# Altium footprint library Package_SO.PcbLib: 333 footprints (part 16 of 21)
Each footprint in its own frame and in the unit in brackets; x right, y up, seen from the top. Pads: shape width x height; smd on the part's side, far side on the other; paste and mask are expansions set on the pad; w line width, h text height; cw(c..) or ccw(c..) is an arc to the next point about the centre after c.
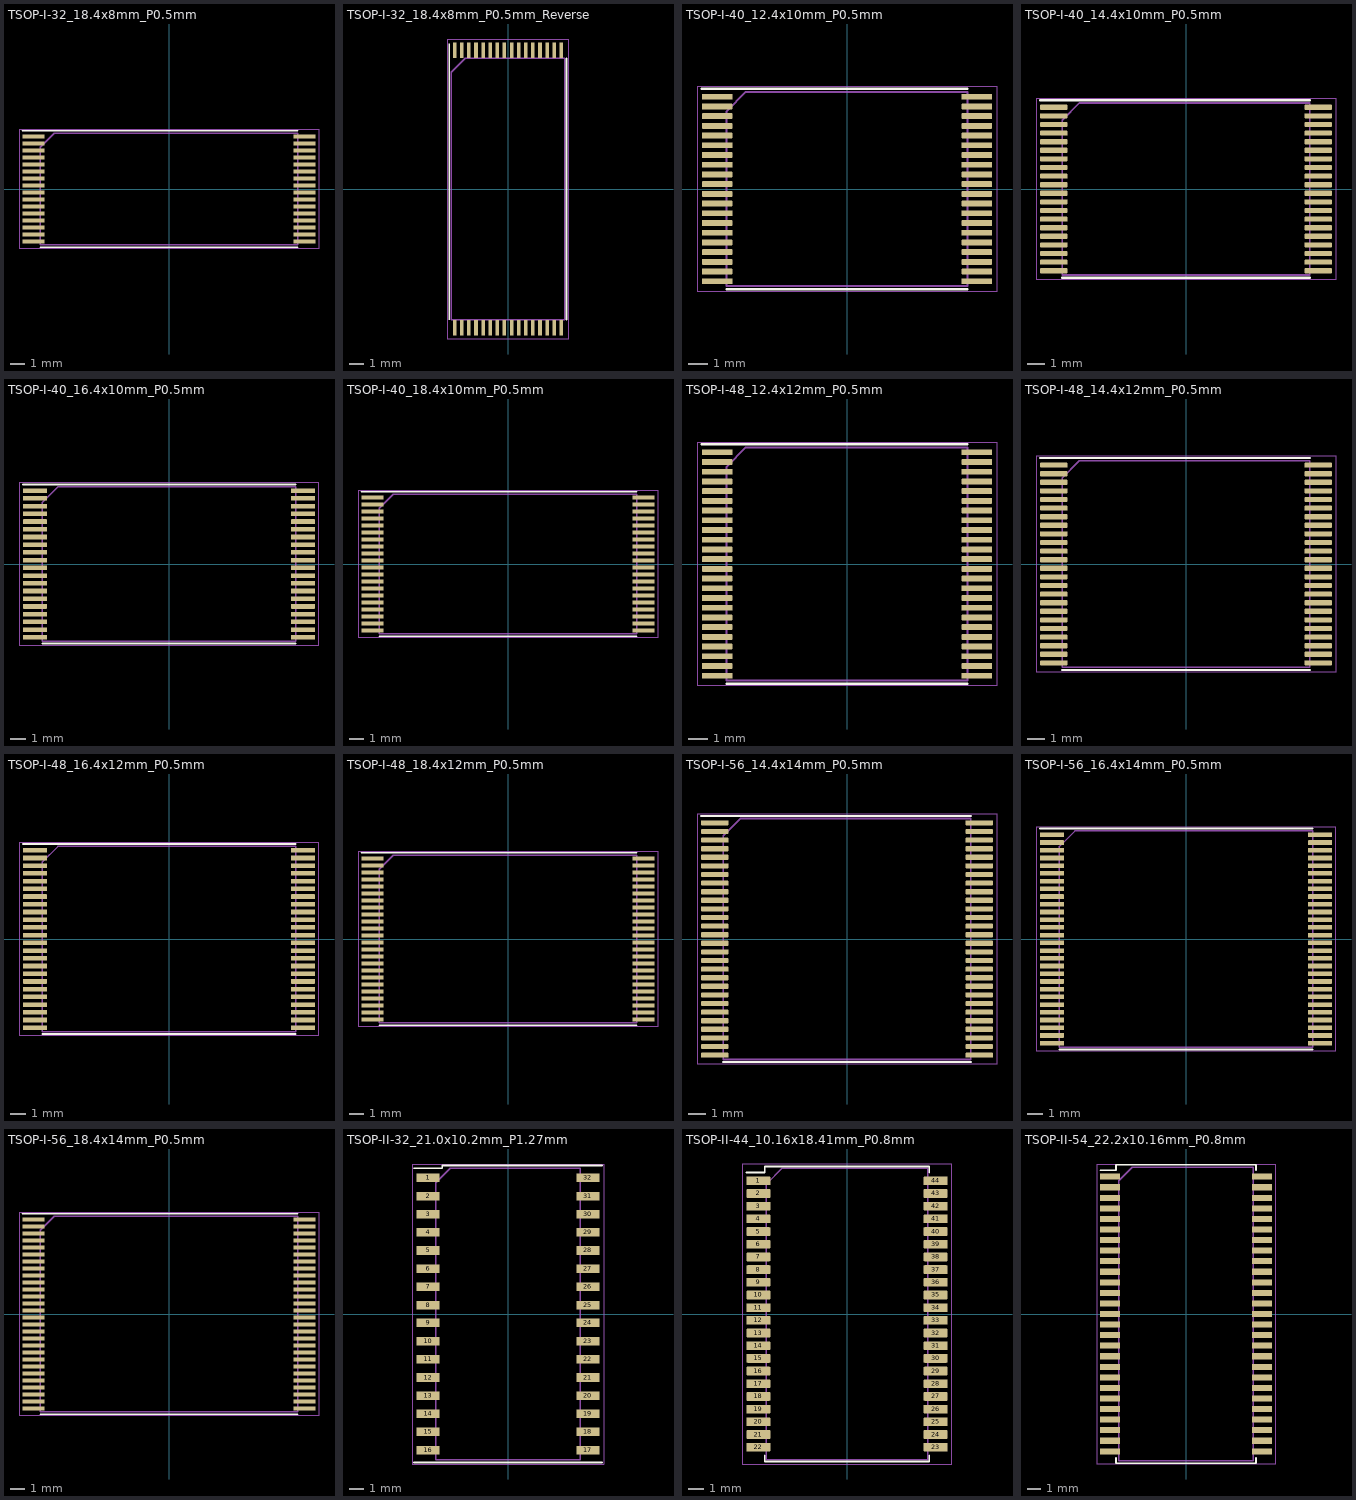
[diagram p15: the footprints below, top view; thin cyan lines are the x and y axes]

## TSOP-I-32_18.4x8mm_P0.5mm [mm]
pads (32):
  rrect25% 1.575x0.3 smd: 1(-9.687,3.75) 2(-9.687,3.25) 3(-9.687,2.75) 4(-9.687,2.25) 5(-9.687,1.75) 6(-9.687,1.25) 7(-9.687,0.75) 8(-9.687,0.25) 9(-9.687,-0.25) 10(-9.687,-0.75) 11(-9.687,-1.25) 12(-9.687,-1.75) 13(-9.687,-2.25) 14(-9.687,-2.75) 15(-9.687,-3.25) 16(-9.687,-3.75) 17(9.687,-3.75) 18(9.687,-3.25) 19(9.687,-2.75) 20(9.687,-2.25) 21(9.687,-1.75) 22(9.687,-1.25) 23(9.687,-0.75) 24(9.687,-0.25) 25(9.687,0.25) 26(9.687,0.75) 27(9.687,1.25) 28(9.687,1.75) 29(9.687,2.25) 30(9.687,2.75) 31(9.687,3.25) 32(9.687,3.75)
F.SilkS:
  lines w0.12: -10.475,4.16 0,4.16 9.2,4.16 ; -9.2,-4.16 0,-4.16 9.2,-4.16
F.CrtYd:
  lines w0.05: -10.73,-4.25 -10.73,4.25 10.73,4.25 10.73,-4.25 -10.73,-4.25
F.Fab:
  lines w0.1: -9.2,-4 9.2,-4 9.2,4 -8.2,4 -9.2,3 -9.2,-4
  text "'.Designator'" at -4.047,-0.84 h1

## TSOP-I-32_18.4x8mm_P0.5mm_Reverse [mm]
pads (32):
  rect 0.25x1.1 smd: 1(-3.75,9.75) 2(-3.25,9.75) 3(-2.75,9.75) 4(-2.25,9.75) 5(-1.75,9.75) 6(-1.25,9.75) 7(-0.75,9.75) 8(-0.25,9.75) 9(0.25,9.75) 10(0.75,9.75) 11(1.25,9.75) 12(1.75,9.75) 13(2.25,9.75) 14(2.75,9.75) 15(3.25,9.75) 16(3.75,9.75) 17(3.75,-9.75) 18(3.25,-9.75) 19(2.75,-9.75) 20(2.25,-9.75) 21(1.75,-9.75) 22(1.25,-9.75) 23(0.75,-9.75) 24(0.25,-9.75) 25(-0.25,-9.75) 26(-0.75,-9.75) 27(-1.25,-9.75) 28(-1.75,-9.75) 29(-2.25,-9.75) 30(-2.75,-9.75) 31(-3.25,-9.75) 32(-3.75,-9.75)
F.SilkS:
  lines w0.1: -4.12,-9.2 -4.12,10.2
  lines w0.12: 4.12,-9.2 4.12,9.2
F.CrtYd:
  lines w0.05: -4.25,-10.55 -4.25,10.55 4.25,10.55 4.25,-10.55 -4.25,-10.55
F.Fab:
  lines w0.1: -4,-9.2 -4,8.2 -3,9.2 4,9.2 4,-9.2 -4,-9.2
  text "'.Designator'" at -4.047,-0.84 h1

## TSOP-I-40_12.4x10mm_P0.5mm [mm]
pads (40):
  rrect25% 1.575x0.3 smd: 1(-6.687,4.75) 2(-6.687,4.25) 3(-6.687,3.75) 4(-6.687,3.25) 5(-6.687,2.75) 6(-6.687,2.25) 7(-6.687,1.75) 8(-6.687,1.25) 9(-6.687,0.75) 10(-6.687,0.25) 11(-6.687,-0.25) 12(-6.687,-0.75) 13(-6.687,-1.25) 14(-6.687,-1.75) 15(-6.687,-2.25) 16(-6.687,-2.75) 17(-6.687,-3.25) 18(-6.687,-3.75) 19(-6.687,-4.25) 20(-6.687,-4.75) 21(6.687,-4.75) 22(6.687,-4.25) 23(6.687,-3.75) 24(6.687,-3.25) 25(6.687,-2.75) 26(6.687,-2.25) 27(6.687,-1.75) 28(6.687,-1.25) 29(6.687,-0.75) 30(6.687,-0.25) 31(6.687,0.25) 32(6.687,0.75) 33(6.687,1.25) 34(6.687,1.75) 35(6.687,2.25) 36(6.687,2.75) 37(6.687,3.25) 38(6.687,3.75) 39(6.687,4.25) 40(6.687,4.75)
F.SilkS:
  lines w0.12: -7.475,5.16 0,5.16 6.2,5.16 ; -6.2,-5.16 0,-5.16 6.2,-5.16
F.CrtYd:
  lines w0.05: -7.72,-5.25 -7.72,5.25 7.72,5.25 7.72,-5.25 -7.72,-5.25
F.Fab:
  lines w0.1: -6.2,-5 6.2,-5 6.2,5 -5.2,5 -6.2,4 -6.2,-5
  text "'.Designator'" at -4.047,-0.84 h1

## TSOP-I-40_14.4x10mm_P0.5mm [mm]
pads (40):
  rrect25% 1.575x0.3 smd: 1(-7.688,4.75) 2(-7.688,4.25) 3(-7.688,3.75) 4(-7.688,3.25) 5(-7.688,2.75) 6(-7.688,2.25) 7(-7.688,1.75) 8(-7.688,1.25) 9(-7.688,0.75) 10(-7.688,0.25) 11(-7.688,-0.25) 12(-7.688,-0.75) 13(-7.688,-1.25) 14(-7.688,-1.75) 15(-7.688,-2.25) 16(-7.688,-2.75) 17(-7.688,-3.25) 18(-7.688,-3.75) 19(-7.688,-4.25) 20(-7.688,-4.75) 21(7.688,-4.75) 22(7.688,-4.25) 23(7.688,-3.75) 24(7.688,-3.25) 25(7.688,-2.75) 26(7.688,-2.25) 27(7.688,-1.75) 28(7.688,-1.25) 29(7.688,-0.75) 30(7.688,-0.25) 31(7.688,0.25) 32(7.688,0.75) 33(7.688,1.25) 34(7.688,1.75) 35(7.688,2.25) 36(7.688,2.75) 37(7.688,3.25) 38(7.688,3.75) 39(7.688,4.25) 40(7.688,4.75)
F.SilkS:
  lines w0.12: -8.475,5.16 0,5.16 7.2,5.16 ; -7.2,-5.16 0,-5.16 7.2,-5.16
F.CrtYd:
  lines w0.05: -8.72,-5.25 -8.72,5.25 8.72,5.25 8.72,-5.25 -8.72,-5.25
F.Fab:
  lines w0.1: -7.2,-5 7.2,-5 7.2,5 -6.2,5 -7.2,4 -7.2,-5
  text "'.Designator'" at -4.047,-0.84 h1

## TSOP-I-40_16.4x10mm_P0.5mm [mm]
pads (40):
  rrect25% 1.575x0.3 smd: 1(-8.688,4.75) 2(-8.688,4.25) 3(-8.688,3.75) 4(-8.688,3.25) 5(-8.688,2.75) 6(-8.688,2.25) 7(-8.688,1.75) 8(-8.688,1.25) 9(-8.688,0.75) 10(-8.688,0.25) 11(-8.688,-0.25) 12(-8.688,-0.75) 13(-8.688,-1.25) 14(-8.688,-1.75) 15(-8.688,-2.25) 16(-8.688,-2.75) 17(-8.688,-3.25) 18(-8.688,-3.75) 19(-8.688,-4.25) 20(-8.688,-4.75) 21(8.688,-4.75) 22(8.688,-4.25) 23(8.688,-3.75) 24(8.688,-3.25) 25(8.688,-2.75) 26(8.688,-2.25) 27(8.688,-1.75) 28(8.688,-1.25) 29(8.688,-0.75) 30(8.688,-0.25) 31(8.688,0.25) 32(8.688,0.75) 33(8.688,1.25) 34(8.688,1.75) 35(8.688,2.25) 36(8.688,2.75) 37(8.688,3.25) 38(8.688,3.75) 39(8.688,4.25) 40(8.688,4.75)
F.SilkS:
  lines w0.12: -9.475,5.16 0,5.16 8.2,5.16 ; -8.2,-5.16 0,-5.16 8.2,-5.16
F.CrtYd:
  lines w0.05: -9.72,-5.25 -9.72,5.25 9.72,5.25 9.72,-5.25 -9.72,-5.25
F.Fab:
  lines w0.1: -8.2,-5 8.2,-5 8.2,5 -7.2,5 -8.2,4 -8.2,-5
  text "'.Designator'" at -4.047,-0.84 h1

## TSOP-I-40_18.4x10mm_P0.5mm [mm]
pads (40):
  rrect25% 1.575x0.3 smd: 1(-9.687,4.75) 2(-9.687,4.25) 3(-9.687,3.75) 4(-9.687,3.25) 5(-9.687,2.75) 6(-9.687,2.25) 7(-9.687,1.75) 8(-9.687,1.25) 9(-9.687,0.75) 10(-9.687,0.25) 11(-9.687,-0.25) 12(-9.687,-0.75) 13(-9.687,-1.25) 14(-9.687,-1.75) 15(-9.687,-2.25) 16(-9.687,-2.75) 17(-9.687,-3.25) 18(-9.687,-3.75) 19(-9.687,-4.25) 20(-9.687,-4.75) 21(9.687,-4.75) 22(9.687,-4.25) 23(9.687,-3.75) 24(9.687,-3.25) 25(9.687,-2.75) 26(9.687,-2.25) 27(9.687,-1.75) 28(9.687,-1.25) 29(9.687,-0.75) 30(9.687,-0.25) 31(9.687,0.25) 32(9.687,0.75) 33(9.687,1.25) 34(9.687,1.75) 35(9.687,2.25) 36(9.687,2.75) 37(9.687,3.25) 38(9.687,3.75) 39(9.687,4.25) 40(9.687,4.75)
F.SilkS:
  lines w0.12: -10.475,5.16 0,5.16 9.2,5.16 ; -9.2,-5.16 0,-5.16 9.2,-5.16
F.CrtYd:
  lines w0.05: -10.73,-5.25 -10.73,5.25 10.73,5.25 10.73,-5.25 -10.73,-5.25
F.Fab:
  lines w0.1: -9.2,-5 9.2,-5 9.2,5 -8.2,5 -9.2,4 -9.2,-5
  text "'.Designator'" at -4.047,-0.84 h1

## TSOP-I-48_12.4x12mm_P0.5mm [mm]
pads (48):
  rrect25% 1.575x0.3 smd: 1(-6.687,5.75) 2(-6.687,5.25) 3(-6.687,4.75) 4(-6.687,4.25) 5(-6.687,3.75) 6(-6.687,3.25) 7(-6.687,2.75) 8(-6.687,2.25) 9(-6.687,1.75) 10(-6.687,1.25) 11(-6.687,0.75) 12(-6.687,0.25) 13(-6.687,-0.25) 14(-6.687,-0.75) 15(-6.687,-1.25) 16(-6.687,-1.75) 17(-6.687,-2.25) 18(-6.687,-2.75) 19(-6.687,-3.25) 20(-6.687,-3.75) 21(-6.687,-4.25) 22(-6.687,-4.75) 23(-6.687,-5.25) 24(-6.687,-5.75) 25(6.687,-5.75) 26(6.687,-5.25) 27(6.687,-4.75) 28(6.687,-4.25) 29(6.687,-3.75) 30(6.687,-3.25) 31(6.687,-2.75) 32(6.687,-2.25) 33(6.687,-1.75) 34(6.687,-1.25) 35(6.687,-0.75) 36(6.687,-0.25) 37(6.687,0.25) 38(6.687,0.75) 39(6.687,1.25) 40(6.687,1.75) 41(6.687,2.25) 42(6.687,2.75) 43(6.687,3.25) 44(6.687,3.75) 45(6.687,4.25) 46(6.687,4.75) 47(6.687,5.25) 48(6.687,5.75)
F.SilkS:
  lines w0.12: -7.475,6.16 0,6.16 6.2,6.16 ; -6.2,-6.16 0,-6.16 6.2,-6.16
F.CrtYd:
  lines w0.05: -7.72,-6.25 -7.72,6.25 7.72,6.25 7.72,-6.25 -7.72,-6.25
F.Fab:
  lines w0.1: -6.2,-6 6.2,-6 6.2,6 -5.2,6 -6.2,5 -6.2,-6
  text "'.Designator'" at -4.047,-0.84 h1

## TSOP-I-48_14.4x12mm_P0.5mm [mm]
pads (48):
  rrect25% 1.575x0.3 smd: 1(-7.688,5.75) 2(-7.688,5.25) 3(-7.688,4.75) 4(-7.688,4.25) 5(-7.688,3.75) 6(-7.688,3.25) 7(-7.688,2.75) 8(-7.688,2.25) 9(-7.688,1.75) 10(-7.688,1.25) 11(-7.688,0.75) 12(-7.688,0.25) 13(-7.688,-0.25) 14(-7.688,-0.75) 15(-7.688,-1.25) 16(-7.688,-1.75) 17(-7.688,-2.25) 18(-7.688,-2.75) 19(-7.688,-3.25) 20(-7.688,-3.75) 21(-7.688,-4.25) 22(-7.688,-4.75) 23(-7.688,-5.25) 24(-7.688,-5.75) 25(7.688,-5.75) 26(7.688,-5.25) 27(7.688,-4.75) 28(7.688,-4.25) 29(7.688,-3.75) 30(7.688,-3.25) 31(7.688,-2.75) 32(7.688,-2.25) 33(7.688,-1.75) 34(7.688,-1.25) 35(7.688,-0.75) 36(7.688,-0.25) 37(7.688,0.25) 38(7.688,0.75) 39(7.688,1.25) 40(7.688,1.75) 41(7.688,2.25) 42(7.688,2.75) 43(7.688,3.25) 44(7.688,3.75) 45(7.688,4.25) 46(7.688,4.75) 47(7.688,5.25) 48(7.688,5.75)
F.SilkS:
  lines w0.12: -8.475,6.16 0,6.16 7.2,6.16 ; -7.2,-6.16 0,-6.16 7.2,-6.16
F.CrtYd:
  lines w0.05: -8.72,-6.25 -8.72,6.25 8.72,6.25 8.72,-6.25 -8.72,-6.25
F.Fab:
  lines w0.1: -7.2,-6 7.2,-6 7.2,6 -6.2,6 -7.2,5 -7.2,-6
  text "'.Designator'" at -4.047,-0.84 h1

## TSOP-I-48_16.4x12mm_P0.5mm [mm]
pads (48):
  rrect25% 1.575x0.3 smd: 1(-8.688,5.75) 2(-8.688,5.25) 3(-8.688,4.75) 4(-8.688,4.25) 5(-8.688,3.75) 6(-8.688,3.25) 7(-8.688,2.75) 8(-8.688,2.25) 9(-8.688,1.75) 10(-8.688,1.25) 11(-8.688,0.75) 12(-8.688,0.25) 13(-8.688,-0.25) 14(-8.688,-0.75) 15(-8.688,-1.25) 16(-8.688,-1.75) 17(-8.688,-2.25) 18(-8.688,-2.75) 19(-8.688,-3.25) 20(-8.688,-3.75) 21(-8.688,-4.25) 22(-8.688,-4.75) 23(-8.688,-5.25) 24(-8.688,-5.75) 25(8.688,-5.75) 26(8.688,-5.25) 27(8.688,-4.75) 28(8.688,-4.25) 29(8.688,-3.75) 30(8.688,-3.25) 31(8.688,-2.75) 32(8.688,-2.25) 33(8.688,-1.75) 34(8.688,-1.25) 35(8.688,-0.75) 36(8.688,-0.25) 37(8.688,0.25) 38(8.688,0.75) 39(8.688,1.25) 40(8.688,1.75) 41(8.688,2.25) 42(8.688,2.75) 43(8.688,3.25) 44(8.688,3.75) 45(8.688,4.25) 46(8.688,4.75) 47(8.688,5.25) 48(8.688,5.75)
F.SilkS:
  lines w0.12: -9.475,6.16 0,6.16 8.2,6.16 ; -8.2,-6.16 0,-6.16 8.2,-6.16
F.CrtYd:
  lines w0.05: -9.72,-6.25 -9.72,6.25 9.72,6.25 9.72,-6.25 -9.72,-6.25
F.Fab:
  lines w0.1: -8.2,-6 8.2,-6 8.2,6 -7.2,6 -8.2,5 -8.2,-6
  text "'.Designator'" at -4.047,-0.84 h1

## TSOP-I-48_18.4x12mm_P0.5mm [mm]
pads (48):
  rrect25% 1.575x0.3 smd: 1(-9.687,5.75) 2(-9.687,5.25) 3(-9.687,4.75) 4(-9.687,4.25) 5(-9.687,3.75) 6(-9.687,3.25) 7(-9.687,2.75) 8(-9.687,2.25) 9(-9.687,1.75) 10(-9.687,1.25) 11(-9.687,0.75) 12(-9.687,0.25) 13(-9.687,-0.25) 14(-9.687,-0.75) 15(-9.687,-1.25) 16(-9.687,-1.75) 17(-9.687,-2.25) 18(-9.687,-2.75) 19(-9.687,-3.25) 20(-9.687,-3.75) 21(-9.687,-4.25) 22(-9.687,-4.75) 23(-9.687,-5.25) 24(-9.687,-5.75) 25(9.687,-5.75) 26(9.687,-5.25) 27(9.687,-4.75) 28(9.687,-4.25) 29(9.687,-3.75) 30(9.687,-3.25) 31(9.687,-2.75) 32(9.687,-2.25) 33(9.687,-1.75) 34(9.687,-1.25) 35(9.687,-0.75) 36(9.687,-0.25) 37(9.687,0.25) 38(9.687,0.75) 39(9.687,1.25) 40(9.687,1.75) 41(9.687,2.25) 42(9.687,2.75) 43(9.687,3.25) 44(9.687,3.75) 45(9.687,4.25) 46(9.687,4.75) 47(9.687,5.25) 48(9.687,5.75)
F.SilkS:
  lines w0.12: -10.475,6.16 0,6.16 9.2,6.16 ; -9.2,-6.16 0,-6.16 9.2,-6.16
F.CrtYd:
  lines w0.05: -10.73,-6.25 -10.73,6.25 10.73,6.25 10.73,-6.25 -10.73,-6.25
F.Fab:
  lines w0.1: -9.2,-6 9.2,-6 9.2,6 -8.2,6 -9.2,5 -9.2,-6
  text "'.Designator'" at -4.047,-0.84 h1

## TSOP-I-56_14.4x14mm_P0.5mm [mm]
pads (56):
  rrect25% 1.575x0.3 smd: 1(-7.688,6.75) 2(-7.688,6.25) 3(-7.688,5.75) 4(-7.688,5.25) 5(-7.688,4.75) 6(-7.688,4.25) 7(-7.688,3.75) 8(-7.688,3.25) 9(-7.688,2.75) 10(-7.688,2.25) 11(-7.688,1.75) 12(-7.688,1.25) 13(-7.688,0.75) 14(-7.688,0.25) 15(-7.688,-0.25) 16(-7.688,-0.75) 17(-7.688,-1.25) 18(-7.688,-1.75) 19(-7.688,-2.25) 20(-7.688,-2.75) 21(-7.688,-3.25) 22(-7.688,-3.75) 23(-7.688,-4.25) 24(-7.688,-4.75) 25(-7.688,-5.25) 26(-7.688,-5.75) 27(-7.688,-6.25) 28(-7.688,-6.75) 29(7.688,-6.75) 30(7.688,-6.25) 31(7.688,-5.75) 32(7.688,-5.25) 33(7.688,-4.75) 34(7.688,-4.25) 35(7.688,-3.75) 36(7.688,-3.25) 37(7.688,-2.75) 38(7.688,-2.25) 39(7.688,-1.75) 40(7.688,-1.25) 41(7.688,-0.75) 42(7.688,-0.25) 43(7.688,0.25) 44(7.688,0.75) 45(7.688,1.25) 46(7.688,1.75) 47(7.688,2.25) 48(7.688,2.75) 49(7.688,3.25) 50(7.688,3.75) 51(7.688,4.25) 52(7.688,4.75) 53(7.688,5.25) 54(7.688,5.75) 55(7.688,6.25) 56(7.688,6.75)
F.SilkS:
  lines w0.12: -8.475,7.16 0,7.16 7.2,7.16 ; -7.2,-7.16 0,-7.16 7.2,-7.16
F.CrtYd:
  lines w0.05: -8.72,-7.25 -8.72,7.25 8.72,7.25 8.72,-7.25 -8.72,-7.25
F.Fab:
  lines w0.1: -7.2,-7 7.2,-7 7.2,7 -6.2,7 -7.2,6 -7.2,-7
  text "'.Designator'" at -4.047,-0.84 h1

## TSOP-I-56_16.4x14mm_P0.5mm [mm]
pads (56):
  rrect25% 1.575x0.3 smd: 1(-8.688,6.75) 2(-8.688,6.25) 3(-8.688,5.75) 4(-8.688,5.25) 5(-8.688,4.75) 6(-8.688,4.25) 7(-8.688,3.75) 8(-8.688,3.25) 9(-8.688,2.75) 10(-8.688,2.25) 11(-8.688,1.75) 12(-8.688,1.25) 13(-8.688,0.75) 14(-8.688,0.25) 15(-8.688,-0.25) 16(-8.688,-0.75) 17(-8.688,-1.25) 18(-8.688,-1.75) 19(-8.688,-2.25) 20(-8.688,-2.75) 21(-8.688,-3.25) 22(-8.688,-3.75) 23(-8.688,-4.25) 24(-8.688,-4.75) 25(-8.688,-5.25) 26(-8.688,-5.75) 27(-8.688,-6.25) 28(-8.688,-6.75) 29(8.688,-6.75) 30(8.688,-6.25) 31(8.688,-5.75) 32(8.688,-5.25) 33(8.688,-4.75) 34(8.688,-4.25) 35(8.688,-3.75) 36(8.688,-3.25) 37(8.688,-2.75) 38(8.688,-2.25) 39(8.688,-1.75) 40(8.688,-1.25) 41(8.688,-0.75) 42(8.688,-0.25) 43(8.688,0.25) 44(8.688,0.75) 45(8.688,1.25) 46(8.688,1.75) 47(8.688,2.25) 48(8.688,2.75) 49(8.688,3.25) 50(8.688,3.75) 51(8.688,4.25) 52(8.688,4.75) 53(8.688,5.25) 54(8.688,5.75) 55(8.688,6.25) 56(8.688,6.75)
F.SilkS:
  lines w0.12: -9.475,7.16 0,7.16 8.2,7.16 ; -8.2,-7.16 0,-7.16 8.2,-7.16
F.CrtYd:
  lines w0.05: -9.72,-7.25 -9.72,7.25 9.72,7.25 9.72,-7.25 -9.72,-7.25
F.Fab:
  lines w0.1: -8.2,-7 8.2,-7 8.2,7 -7.2,7 -8.2,6 -8.2,-7
  text "'.Designator'" at -4.047,-0.84 h1

## TSOP-I-56_18.4x14mm_P0.5mm [mm]
pads (56):
  rrect25% 1.575x0.3 smd: 1(-9.687,6.75) 2(-9.687,6.25) 3(-9.687,5.75) 4(-9.687,5.25) 5(-9.687,4.75) 6(-9.687,4.25) 7(-9.687,3.75) 8(-9.687,3.25) 9(-9.687,2.75) 10(-9.687,2.25) 11(-9.687,1.75) 12(-9.687,1.25) 13(-9.687,0.75) 14(-9.687,0.25) 15(-9.687,-0.25) 16(-9.687,-0.75) 17(-9.687,-1.25) 18(-9.687,-1.75) 19(-9.687,-2.25) 20(-9.687,-2.75) 21(-9.687,-3.25) 22(-9.687,-3.75) 23(-9.687,-4.25) 24(-9.687,-4.75) 25(-9.687,-5.25) 26(-9.687,-5.75) 27(-9.687,-6.25) 28(-9.687,-6.75) 29(9.687,-6.75) 30(9.687,-6.25) 31(9.687,-5.75) 32(9.687,-5.25) 33(9.687,-4.75) 34(9.687,-4.25) 35(9.687,-3.75) 36(9.687,-3.25) 37(9.687,-2.75) 38(9.687,-2.25) 39(9.687,-1.75) 40(9.687,-1.25) 41(9.687,-0.75) 42(9.687,-0.25) 43(9.687,0.25) 44(9.687,0.75) 45(9.687,1.25) 46(9.687,1.75) 47(9.687,2.25) 48(9.687,2.75) 49(9.687,3.25) 50(9.687,3.75) 51(9.687,4.25) 52(9.687,4.75) 53(9.687,5.25) 54(9.687,5.75) 55(9.687,6.25) 56(9.687,6.75)
F.SilkS:
  lines w0.12: -10.475,7.16 0,7.16 9.2,7.16 ; -9.2,-7.16 0,-7.16 9.2,-7.16
F.CrtYd:
  lines w0.05: -10.73,-7.25 -10.73,7.25 10.73,7.25 10.73,-7.25 -10.73,-7.25
F.Fab:
  lines w0.1: -9.2,-7 9.2,-7 9.2,7 -8.2,7 -9.2,6 -9.2,-7
  text "'.Designator'" at -4.047,-0.84 h1

## TSOP-II-32_21.0x10.2mm_P1.27mm [mm]
pads (32):
  rect 1.6x0.6 smd: 1(-5.6,9.525) 2(-5.6,8.255) 3(-5.6,6.985) 4(-5.6,5.715) 5(-5.6,4.445) 6(-5.6,3.175) 7(-5.6,1.905) 8(-5.6,0.625) 9(-5.6,-0.625) 10(-5.6,-1.905) 11(-5.6,-3.175) 12(-5.6,-4.445) 13(-5.6,-5.715) 14(-5.6,-6.985) 15(-5.6,-8.255) 16(-5.6,-9.525) 17(5.6,-9.525) 18(5.6,-8.255) 19(5.6,-6.985) 20(5.6,-5.715) 21(5.6,-4.445) 22(5.6,-3.175) 23(5.6,-1.905) 24(5.6,-0.625) 25(5.6,0.625) 26(5.6,1.905) 27(5.6,3.175) 28(5.6,4.445) 29(5.6,5.715) 30(5.6,6.985) 31(5.6,8.255) 32(5.6,9.525)
F.SilkS:
  lines w0.12: -6.6,-10.4 6.6,-10.4 ; -6.6,10.2 -4.6,10.2 -4.6,10.4 6.6,10.4
F.CrtYd:
  lines w0.05: -6.7,-10.5 -6.7,10.5 6.7,10.5 6.7,-10.5 -6.7,-10.5
F.Fab:
  lines w0.1: -5.05,-10.2 5.05,-10.2 5.05,10.2 -4.05,10.2 -5.05,9.2 -5.05,-10.2
  text "'.Designator'" at -3.267,-0.702 h0.8

## TSOP-II-44_10.16x18.41mm_P0.8mm [mm]
pads (44):
  rrect25% 1.525x0.55 smd: 1(-5.587,8.4) 2(-5.587,7.6) 3(-5.587,6.8) 4(-5.587,6) 5(-5.587,5.2) 6(-5.587,4.4) 7(-5.587,3.6) 8(-5.587,2.8) 9(-5.587,2) 10(-5.587,1.2) 11(-5.587,0.4) 12(-5.587,-0.4) 13(-5.587,-1.2) 14(-5.587,-2) 15(-5.587,-2.8) 16(-5.587,-3.6) 17(-5.587,-4.4) 18(-5.587,-5.2) 19(-5.587,-6) 20(-5.587,-6.8) 21(-5.587,-7.6) 22(-5.587,-8.4) 23(5.587,-8.4) 24(5.587,-7.6) 25(5.587,-6.8) 26(5.587,-6) 27(5.587,-5.2) 28(5.587,-4.4) 29(5.587,-3.6) 30(5.587,-2.8) 31(5.587,-2) 32(5.587,-1.2) 33(5.587,-0.4) 34(5.587,0.4) 35(5.587,1.2) 36(5.587,2) 37(5.587,2.8) 38(5.587,3.6) 39(5.587,4.4) 40(5.587,5.2) 41(5.587,6) 42(5.587,6.8) 43(5.587,7.6) 44(5.587,8.4)
F.SilkS:
  lines w0.12: -6.35,8.935 -5.19,8.935 -5.19,9.315 0,9.315 5.19,9.315 5.19,8.935 ; -5.19,-8.935 -5.19,-9.315 0,-9.315 5.19,-9.315 5.19,-8.935
F.CrtYd:
  lines w0.05: -6.6,-9.46 6.6,-9.46 6.6,9.46 -6.6,9.46 -6.6,-9.46
F.Fab:
  lines w0.1: -5.08,-9.205 -5.08,8.205 -4.08,9.205 5.08,9.205 5.08,-9.205 -5.08,-9.205
  text "'.Designator'" at -4.047,-0.84 h1

## TSOP-II-54_22.2x10.16mm_P0.8mm [mm]
pads (54):
  rect 1.51x0.458 smd: 1(-5.75,10.4) 2(-5.75,9.6) 3(-5.75,8.8) 4(-5.75,8) 5(-5.75,7.2) 6(-5.75,6.4) 7(-5.75,5.6) 8(-5.75,4.8) 9(-5.75,4) 10(-5.75,3.2) 11(-5.75,2.4) 12(-5.75,1.6) 13(-5.75,0.8) 14(-5.75,0) 15(-5.75,-0.8) 16(-5.75,-1.6) 17(-5.75,-2.4) 18(-5.75,-3.2) 19(-5.75,-4) 20(-5.75,-4.8) 21(-5.75,-5.6) 22(-5.75,-6.4) 23(-5.75,-7.2) 24(-5.75,-8) 25(-5.75,-8.8) 26(-5.75,-9.6) 27(-5.75,-10.4) 28(5.75,-10.4) 29(5.75,-9.6) 30(5.75,-8.8) 31(5.75,-8) 32(5.75,-7.2) 33(5.75,-6.4) 34(5.75,-5.6) 35(5.75,-4.8) 36(5.75,-4) 37(5.75,-3.2) 38(5.75,-2.4) 39(5.75,-1.6) 40(5.75,-0.8) 41(5.75,0) 42(5.75,0.8) 43(5.75,1.6) 44(5.75,2.4) 45(5.75,3.2) 46(5.75,4) 47(5.75,4.8) 48(5.75,5.6) 49(5.75,6.4) 50(5.75,7.2) 51(5.75,8) 52(5.75,8.8) 53(5.75,9.6) 54(5.75,10.4)
F.SilkS:
  lines w0.12: -6.5,10.9 -5.3,10.9 -5.3,11.3 5.3,11.3 5.3,10.9 ; -5.3,-10.9 -5.3,-11.3 5.3,-11.3 5.3,-10.9
F.CrtYd:
  lines w0.05: -6.76,-11.36 -6.76,11.36 6.76,11.36 6.76,-11.36 -6.76,-11.36
F.Fab:
  lines w0.1: -5.08,-11.11 -5.08,10.11 -4.08,11.11 5.08,11.11 5.08,-11.11 -5.08,-11.11
  text "'.Designator'" at -4.047,-0.84 h1